# Altium footprint library PART.PcbLib: 407 footprints (part 9 of 26)
Each footprint in its own frame and in the unit in brackets; x right, y up, seen from the top. Pads: shape width x height; smd on the part's side, far side on the other; paste and mask are expansions set on the pad; w line width, h text height; cw(c..) or ccw(c..) is an arc to the next point about the centre after c.
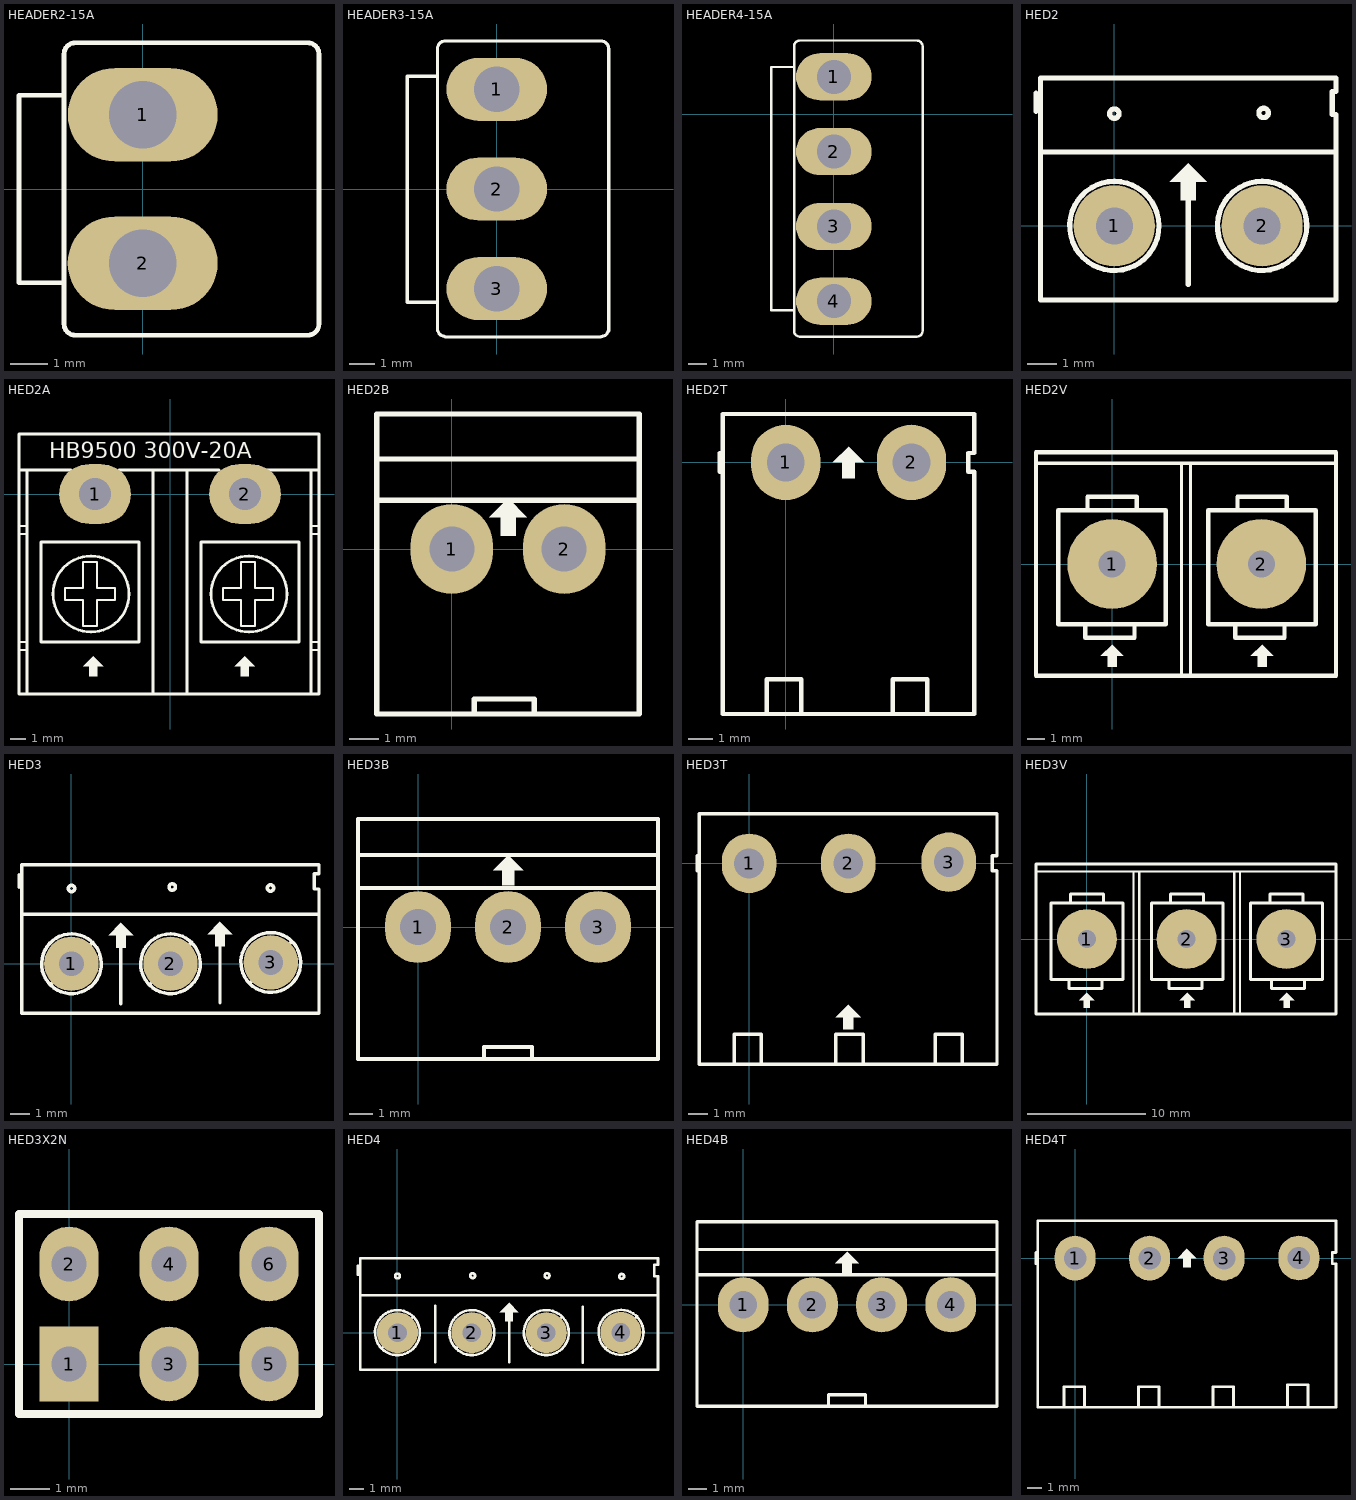
[diagram p8: the footprints below, top view; thin cyan lines are the x and y axes]

## HEADER2-15A [mm]
pads (2):
  oval 4x2.5 hole 1.8: 1(0,1.98) 2(0,-1.98)
Top Overlay:
  lines w0.127: -2.1,-2.5 -3.3,-2.5 -3.3,2.5 -2.1,2.5 ; -0.5,-2.5 0.5,-2.5 ; -0.5,-2.5 -0.5,-1.5 ; -0.5,-2.5 -0.3,-2.3 ; -0.5,-1.5 -0.3,-1.7 ; -0.5,-1.5 0.5,-1.5 ; -0.5,1.5 -0.5,2.5 ; -0.5,1.5 -0.3,1.7 ; -0.5,1.5 0.5,1.5 ; -0.5,2.5 -0.3,2.3 ; -0.5,2.5 0.5,2.5 ; -0.3,-2.3 -0.3,-1.7 ; -0.3,-2.3 0.3,-2.3 ; -0.3,-1.7 0.3,-1.7 ; -0.3,1.7 -0.3,2.3 ; -0.3,1.7 0.3,1.7 ; -0.3,2.3 0.3,2.3 ; 0.3,-2.3 0.5,-2.5 ; 0.3,-2.3 0.3,-1.7 ; 0.3,-1.7 0.5,-1.5 ; 0.3,1.7 0.5,1.5 ; 0.3,1.7 0.3,2.3 ; 0.3,2.3 0.5,2.5 ; 0.5,-2.5 0.5,-1.5 ; 0.5,1.5 0.5,2.5 ; -2.1,-3.6 ccw(c-1.8,-3.6) -1.8,-3.9 4.4,-3.9 ccw(c4.4,-3.6) 4.7,-3.6 4.7,3.6 ccw(c4.4,3.6) 4.4,3.9 -1.8,3.9 ccw(c-1.8,3.6) -2.1,3.6 -2.1,-3.6
3D body: height 11.25, standoff -3.55, extent -3.8,-3.9 4.7,3.9

## HEADER3-15A [mm]
pads (3):
  oval 4x2.5 hole 1.8: 1(0,3.96) 2(0,0) 3(0,-3.96)
Top Overlay:
  lines w0.127: -2.354,-5.64 -2.354,5.58 cw(c-2.054,5.58) -2.054,5.88 4.146,5.88 cw(c4.146,5.58) 4.446,5.58 4.446,-5.64 ; -2.354,-5.557 ccw(c-2.054,-5.557) -2.054,-5.857 ; -2.354,-4.497 -3.554,-4.497 -3.554,4.48 -2.354,4.48 ; -2.054,-5.88 4.146,-5.88 ; 4.146,-5.857 ccw(c4.146,-5.557) 4.446,-5.557 ; -0.5,-0.52 0.5,-0.52 ; -0.5,-0.52 -0.5,0.48 ; -0.5,-0.52 -0.3,-0.32 ; -0.5,0.48 -0.3,0.28 ; -0.5,0.48 0.5,0.48 ; -0.5,3.48 -0.5,4.48 ; -0.5,3.48 -0.3,3.68 ; -0.5,3.48 0.5,3.48 ; -0.5,4.48 -0.3,4.28 ; -0.5,4.48 0.5,4.48 ; -0.3,-0.32 -0.3,0.28 ; -0.3,-0.32 0.3,-0.32 ; -0.3,0.28 0.3,0.28 ; -0.3,3.68 -0.3,4.28 ; -0.3,3.68 0.3,3.68 ; -0.3,4.28 0.3,4.28 ; 0.3,-0.32 0.5,-0.52 ; 0.3,-0.32 0.3,0.28 ; 0.3,0.28 0.5,0.48 ; 0.3,3.68 0.5,3.48 ; 0.3,3.68 0.3,4.28 ; 0.3,4.28 0.5,4.48 ; 0.5,-0.52 0.5,0.48 ; 0.5,3.48 0.5,4.48
3D body: height 11.25, standoff -3.55, extent -3.8,-1.995 4.7,5.805
3D body: height 11.25, standoff -3.55, extent -3.8,-5.932 4.7,1.868

## HEADER4-15A [mm]
pads (4):
  oval 4x2.5 hole 1.8: 1(0,1.98) 2(0,-1.98) 3(0,-5.94) 4(0,-9.9)
Top Overlay:
  lines w0.127: -3.3,-5.461 -3.3,2.5 -2.1,2.5 ; -3.3,-5.374 -3.3,-10.374 -2.1,-10.374 ; -2.1,-4.47 -2.1,3.6 cw(c-1.8,3.6) -1.8,3.9 4.4,3.9 cw(c4.4,3.6) 4.7,3.6 4.7,-3.6 ; -2.1,-4.274 -2.1,-11.474 ccw(c-1.8,-11.474) -1.8,-11.774 4.4,-11.774 ccw(c4.4,-11.474) 4.7,-11.474 4.7,-3.556 ; -0.5,-10.374 0.5,-10.374 ; -0.5,-10.374 -0.5,-9.374 ; -0.5,-10.374 -0.3,-10.174 ; -0.5,-9.374 -0.3,-9.574 ; -0.5,-9.374 0.5,-9.374 ; -0.5,-6.374 -0.5,-5.374 ; -0.5,-6.374 -0.3,-6.174 ; -0.5,-6.374 0.5,-6.374 ; -0.5,-5.374 -0.3,-5.574 ; -0.5,-5.374 0.5,-5.374 ; -0.5,-2.5 -0.3,-2.3 ; -0.5,-2.5 -0.5,-1.5 ; -0.5,-2.5 0.5,-2.5 ; -0.5,-1.5 0.5,-1.5 ; -0.5,-1.5 -0.3,-1.7 ; -0.5,1.5 0.5,1.5 ; -0.5,1.5 -0.3,1.7 ; -0.5,1.5 -0.5,2.5 ; -0.5,2.5 0.5,2.5 ; -0.5,2.5 -0.3,2.3 ; -0.3,-10.174 -0.3,-9.574 ; -0.3,-10.174 0.3,-10.174 ; -0.3,-9.574 0.3,-9.574 ; -0.3,-6.174 -0.3,-5.574 ; -0.3,-6.174 0.3,-6.174 ; -0.3,-5.574 0.3,-5.574 ; -0.3,-2.3 0.3,-2.3 ; -0.3,-2.3 -0.3,-1.7 ; -0.3,-1.7 0.3,-1.7 ; -0.3,1.7 0.3,1.7 ; -0.3,1.7 -0.3,2.3 ; -0.3,2.3 0.3,2.3 ; 0.3,-10.174 0.5,-10.374 ; 0.3,-10.174 0.3,-9.574 ; 0.3,-9.574 0.5,-9.374 ; 0.3,-6.174 0.5,-6.374 ; 0.3,-6.174 0.3,-5.574 ; 0.3,-5.574 0.5,-5.374 ; 0.3,-2.3 0.3,-1.7 ; 0.3,-2.3 0.5,-2.5 ; 0.3,-1.7 0.5,-1.5 ; 0.3,1.7 0.3,2.3 ; 0.3,1.7 0.5,1.5 ; 0.3,2.3 0.5,2.5 ; 0.5,-10.374 0.5,-9.374 ; 0.5,-6.374 0.5,-5.374 ; 0.5,-2.5 0.5,-1.5 ; 0.5,1.5 0.5,2.5
3D body: height 11.25, standoff -3.55, extent -3.8,-3.9 4.7,3.9
3D body: height 11.25, standoff -3.55, extent -3.8,-11.774 4.7,-3.974

## HED2 [mil] "Header 2, 2 pin, hight 300mil, Pin to Pin 200, Colour Green"
height 300
pads (2):
  round 110 hole 50: 1(0,0) 2(200,0)
Top Overlay:
  circle w7: c202,153 r6.4
  circle w7: c0,152 r6.4
  region: 100,85 75,60 90,60 90,35 110,35 110,60 125,60
  lines w7: -106,155 -106,180 ; -98,100 299,100 ; 38.83,46.23 ccw(c0,0) 40.11,45.12 ; 100,-79 100,72 ; 238.74,46.3 ccw(c200,0) 240.11,45.12 ; -100,-100 -100,50 -100,200 300,200 300,182 295,182 295,151 300,151 300,-100 -100,-100
3D body: height 393.7, standoff -157.48, extent -91.85,-90 301.85,205.28

## HED2A [mil] "Header 2: 300V-20A, 2 pin, hight 300mil, Pin to Pin 400, Colour Green"
height 300
pads (2):
  oval 180x150 hole 80: 1(-187.5,0) 2(187.5,0)
Top Overlay:
  circle w7: c197.5,-250 r95
  circle w7: c-197.5,-250 r95
  region: 187.5,-405 162.5,-430 177.5,-430 177.5,-455 197.5,-455 197.5,-430 212.5,-430
  region: -192.5,-405 -217.5,-430 -202.5,-430 -202.5,-455 -182.5,-455 -182.5,-430 -167.5,-430
  lines w5: -375,-390 -360,-390 ; -375,-370 -360,-370 ; -375,-100 -360,-100 ; -375,-80 -360,-80 ; 355,-390 370,-390 ; 355,-370 370,-370 ; 355,-100 370,-100 ; 355,-80 370,-80 ; -262.5,-265 -217.5,-265 -217.5,-330 -182.5,-330 -182.5,-265 -137.5,-265 -137.5,-235 -182.5,-235 -182.5,-170 -217.5,-170 -217.5,-235 -262.5,-235 -262.5,-265 ; 132.5,-265 132.5,-235 177.5,-235 177.5,-170 212.5,-170 212.5,-235 257.5,-235 257.5,-265 212.5,-265 212.5,-330 177.5,-330 177.5,-265 132.5,-265
  lines w7: -377.5,60 -247.5,60 ; -357.5,-495 -357.5,60 ; -127.5,60 122.5,60 ; -42.5,-495 -42.5,60 ; 42.5,-495 42.5,60 ; 242.5,60 372.5,60 ; 352.5,-495 352.5,60 ; -377.5,-500 372.5,-500 372.5,150 -377.5,150 -377.5,-500 ; -322.5,-370 -322.5,-120 -77.5,-120 -77.5,-370 -322.5,-370 ; 77.5,-370 322.5,-370 322.5,-120 77.5,-120 77.5,-370
  text "HB9500 300V-20A" at -302.5,90 h40

## HED2B [mil] "Header 2, 2 pin, hight 300mil, Pin to Pin 150, Colour White"
height 300
pads (2):
  oval 110x120 hole 60: 1(0,0) 2(150,0)
Top Overlay:
  region: 75,67.5 50,42.5 65,42.5 65,17.5 85,17.5 85,42.5 100,42.5
  lines w7: -100,65 250,65 ; -100,120 250,120 ; 30,-220 30,-200 110,-200 110,-220 ; -100,-220 -100,180 250,180 250,-220 -100,-220

## HED2T [mil] "Header 2, 2 pin, hight 300mil, Pin to Pin 200, Colour Green"
height 300
pads (2):
  oval 110x120 hole 60: 1(0,0) 2(200,0)
Top Overlay:
  region: 100,25 75,0 90,0 90,-25 110,-25 110,0 125,0
  lines w7: -105,-15 -105,15 ; -30,-400 -30,-345 25,-345 25,-400 ; 170,-400 170,-345 225,-345 225,-400 ; -100,-400 -100,77 300,77 300,15 290,15 290,-15 300,-15 300,-400 -100,-400
3D body: height 333.51, standoff -157.48, extent -98,-400.22 295.7,72.22

## HED2V [mil] "Header 6"
height 300
pads (2):
  round 200 hole 60: 1(0,0) 2(333.33,0)
Top Overlay:
  region: 0,-180 -25,-205 -10,-205 -10,-230 10,-230 10,-205 25,-205
  region: 335,-180 310,-205 325,-205 325,-230 345,-230 345,-205 360,-205
  lines w7: -170,225 499,225 ; 155,-250 155,225 ; 175,-250 175,225
  lines w10: -60,-135 -60,-165 50,-165 50,-135 ; -55,120 -55,150 55,150 55,120 ; 275,-135 275,-165 385,-165 385,-135 ; 280,120 280,150 390,150 390,120 ; -170,-250 500,-250 500,250 -170,250 -170,-250 ; -120,-135 -120,120 120,120 120,-135 -120,-135 ; 215,-135 455,-135 455,120 215,120 215,-135

## HED3 [mil] "Header 3, 3 pin, hight 300mil, Pin to Pin 200, Colour Green"
height 300
pads (3):
  round 110 hole 50: 1(0,0) 2(200,0) 3(402.62,2.62)
Top Overlay:
  circle w7: c402,153 r6.4
  circle w7: c0,152 r6.4
  circle w7: c203.6,155 r6.4
  region: 300,85 275,60 290,60 290,35 310,35 310,60 325,60
  region: 100,82.5 75,57.5 90,57.5 90,32.5 110,32.5 110,57.5 125,57.5
  lines w7: -106,155 -106,180 ; -100,100 500,100 ; -42,-42 43,43 ; 39.44,45.71 ccw(c0,0) 44.97,40.28 ; 100,-81 100,70 ; 158.5,-41.5 243,43 ; 238.89,46.18 ccw(c200,0) 245.38,39.82 ; 300,-79 300,72 ; 360,-39 445,45 ; 441.65,48.68 ccw(c402.62,2.62) 448.22,42.19 ; -100,-100 500,-100 500,151 490,151 490,182 500,182 500,200 -100,200 -100,50 -100,-100

## HED3B [mil] "Header 3, 3 pin, hight 300mil, Pin to Pin 150, Colour White"
height 300
pads (3):
  oval 110x120 hole 60: 1(0,0) 2(150,0) 3(300,0)
Top Overlay:
  region: 150,120 125,95 140,95 140,70 160,70 160,95 175,95
  lines w7: -100,65 400,65 ; -100,120 400,120 ; 110,-220 110,-200 190,-200 190,-220 ; -100,-220 -100,180 400,180 400,-220 -100,-220

## HED3T [mil] "Header 3, 3 pin, hight 300mil, Pin to Pin 200, Colour Green"
height 300
pads (3):
  oval 110x120 hole 60: 1(0,0) 2(200,0) 3(402.62,2.62)
Top Overlay:
  region: 200,-285 175,-310 190,-310 190,-335 210,-335 210,-310 225,-310
  lines w7: -105,-15 -105,15 ; -30,-400 -30,-345 25,-345 25,-400 ; 175,-400 175,-345 230,-345 230,-400 ; 375,-400 375,-345 430,-345 430,-400 ; -100,-405 -100,100 500,100 500,15 490,15 490,-15 500,-15 500,-405 -100,-405

## HED3V [mil] "Header 3 - 20A"
height 300
pads (3):
  round 200 hole 60: 1(0,0) 2(333,0) 3(666,0)
Top Overlay:
  region: 0,-180 -25,-205 -10,-205 -10,-230 10,-230 10,-205 25,-205
  region: 335,-180 310,-205 325,-205 325,-230 345,-230 345,-205 360,-205
  region: 667,-180 692,-205 677,-205 677,-230 657,-230 657,-205 642,-205
  lines w7: -170,225 829,225 ; 155,-250 155,225 ; 175,-250 175,225 ; 492,-250 492,225 ; 512,-250 512,225
  lines w10: -60,-135 -60,-165 50,-165 50,-135 ; -55,120 -55,150 55,150 55,120 ; 275,-135 275,-165 385,-165 385,-135 ; 280,120 280,150 390,150 390,120 ; 612,120 612,150 722,150 722,120 ; 617,-135 617,-165 727,-165 727,-135 ; 831,250 -170,250 -170,-250 832,-250 832,250 ; -120,-135 -120,120 120,120 120,-135 -120,-135 ; 215,-135 455,-135 455,120 215,120 215,-135 ; 547,-135 547,120 787,120 787,-135 547,-135

## HED3X2N [mm] "Connector; Header; 3x2 Position"
pads (6):
  rect 1.5x1.9 hole 0.9: 1(0,0)
  oval 1.5x1.9 hole 0.9: 2(0,2.54) 3(2.54,0) 4(2.54,2.54) 5(5.08,0) 6(5.08,2.54)
Top Overlay:
  lines w0.2: -1.27,-1.27 -1.27,3.81 6.35,3.81 6.35,-1.27 -1.27,-1.27

## HED4 [mil] "Header 4, 4 pin, hight 300mil, Pin to Pin 200, Colour Green"
height 300
pads (4):
  round 110 hole 50: 1(0,0) 2(200,0) 3(400.06,0.06) 4(600.39,0.39)
Top Overlay:
  circle w7: c202,153 r6.4
  circle w7: c0,152 r6.4
  circle w7: c402,153 r6.4
  circle w7: c602.6,151 r6.4
  region: 300,80 275,55 290,55 290,30 310,30 310,55 325,55
  lines w7: -106,155 -106,180 ; -100,100 700,100 ; -42,-42 43,43 ; 39.04,46.05 ccw(c0,0) 45.18,40.05 ; 102,-79 102,72 ; 158,-42 242.5,42.5 ; 239.76,45.44 ccw(c200,0) 245.18,40.05 ; 300,-79 300,40 ; 358.5,-41.5 442.5,42.5 ; 439.27,45.97 ccw(c400.06,0.06) 445.19,40.17 ; 497.97,-81.03 497.97,69.97 ; 559,-41 643.5,43.5 ; 640.16,46.18 ccw(c600.59,0.59) 646.12,40.23 ; -100,-100 -100,50 -100,200 700,200 700,182 690,182 690,151 700,151 700,-100 -100,-100

## HED4B [mil] "Header 4, 4 pin, hight 300mil, Pin to Pin 150, Colour White"
height 300
pads (4):
  oval 110x120 hole 60: 1(0,0) 2(150,0) 3(300,0) 4(450,0)
Top Overlay:
  region: 225,115 200,90 215,90 215,65 235,65 235,90 250,90
  lines w7: -100,65 550,65 ; -100,120 550,120 ; 185,-215 185,-195 265,-195 265,-215 ; -100,-220 550,-220 550,180 -100,180 -100,-220

## HED4T [mil] "Header 4, 4 pin, hight 300mil, Pin to Pin 200, Colour Green"
height 300
pads (4):
  oval 110x120 hole 60: 1(0,0) 2(200,0) 3(400.06,0.06) 4(600.39,0.39)
Top Overlay:
  region: 300,25 275,0 290,0 290,-25 310,-25 310,0 325,0
  lines w7: -105,-15 -105,15 ; -30,-400 -30,-345 25,-345 25,-400 ; 170,-400 170,-345 225,-345 225,-400 ; 370,-400 370,-345 425,-345 425,-400 ; 570,-395 570,-340 625,-340 625,-395 ; -100,-400 700,-400 700,-15 690,-15 690,15 700,15 700,100 -100,100 -100,-400